# Altium footprint library 5.12-直插元件.PcbLib: 165 footprints (part 3 of 11)
Each footprint in its own frame and in the unit in brackets; x right, y up, seen from the top. Pads: shape width x height; smd on the part's side, far side on the other; paste and mask are expansions set on the pad; w line width, h text height; cw(c..) or ccw(c..) is an arc to the next point about the centre after c.
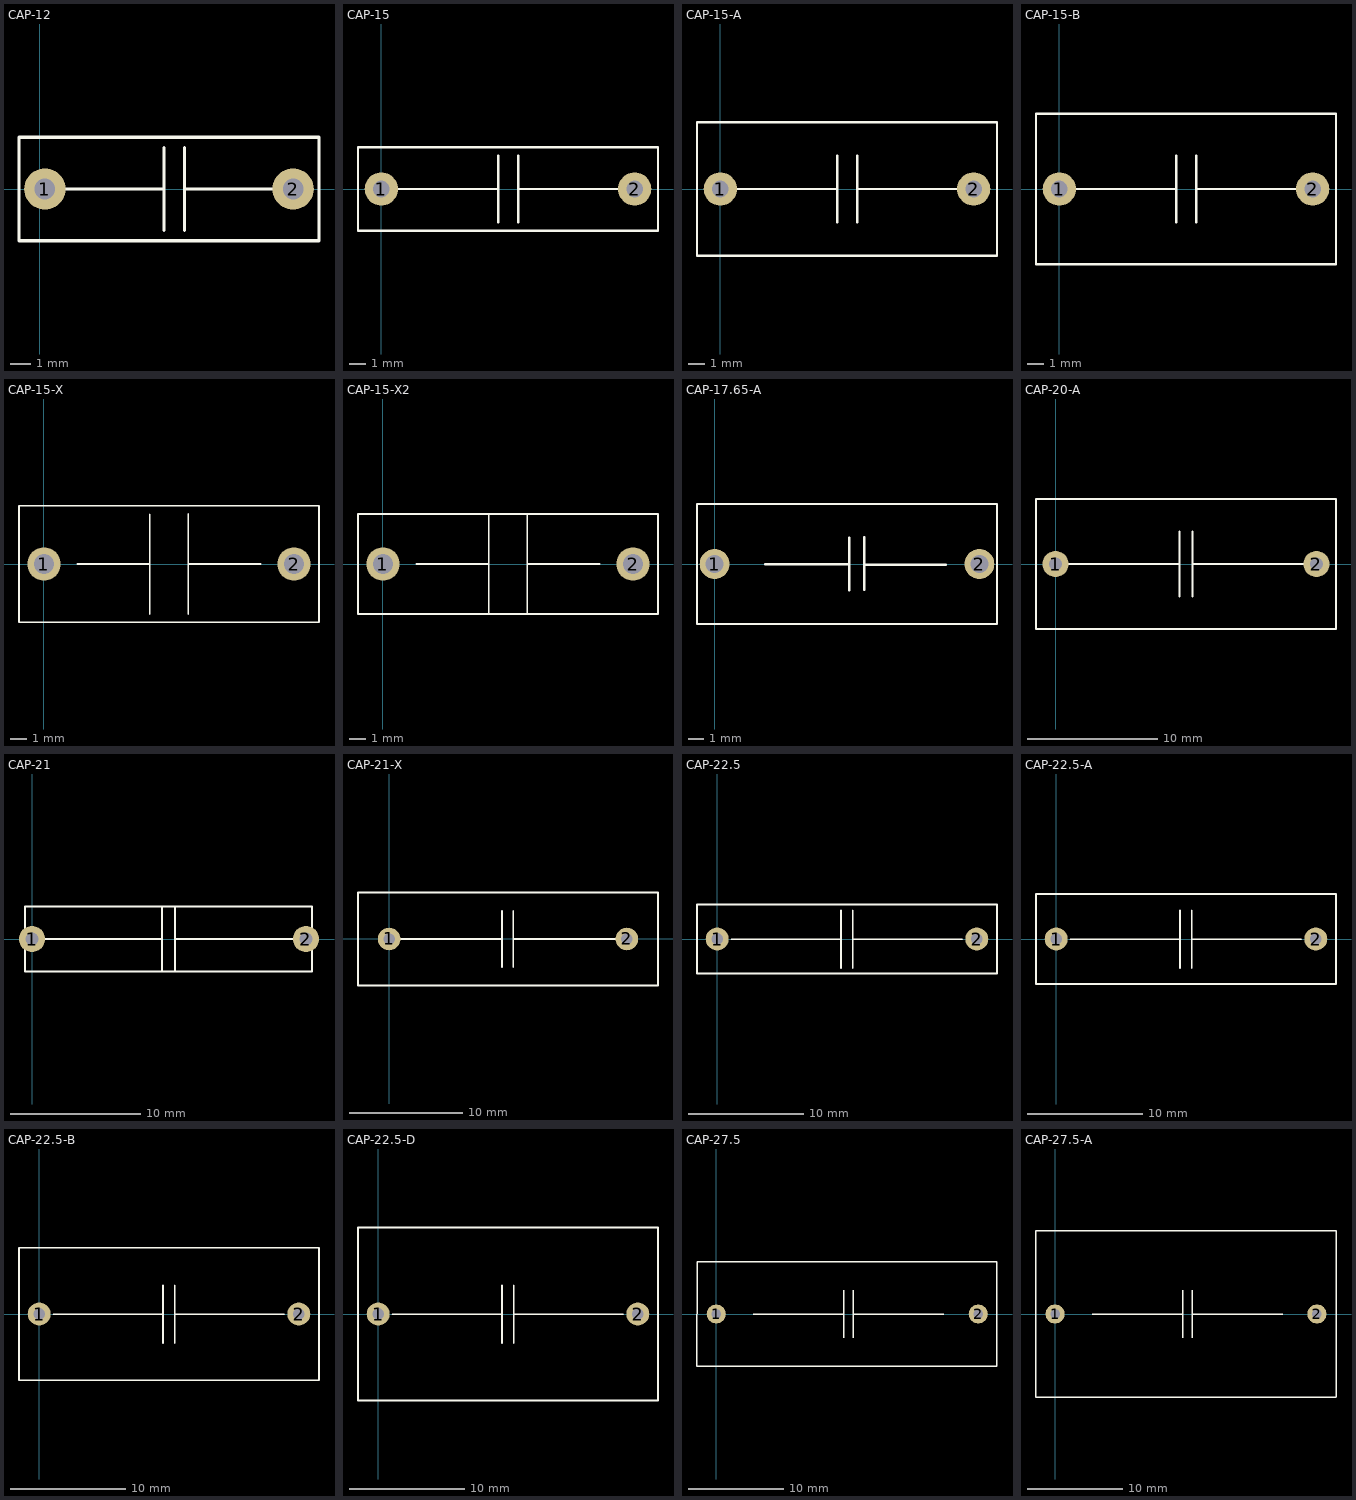
[diagram p2: the footprints below, top view; thin cyan lines are the x and y axes]

## CAP-12 [mm] "[ PCBѧϰȺ514746572 ]"
pads (2):
  round 2 hole 1: 1(0.25,0) 2(12.25,0)
Top Overlay:
  lines w0.15: 0,0 6,0 ; 6,-2 6,2 ; 7,-2 7,2 ; 7,0 13,0 ; -1,-2.5 -1,2.5 13.5,2.5 13.5,-2.5 -1,-2.5
3D body "User Library-SV07AC104KAA.step": height 12.7, standoff -31.75, extent -0.989,-2.54 13.489,2.54

## CAP-15 [mm] "[ PCBѧϰȺ514746572 ]"
pads (2):
  round 2 hole 1: 1(0,0) 2(15.2,0)
Top Overlay:
  lines w0.15: 0,0 7,0 ; 7,-2 7,2 ; 8.2,-2 8.2,2 ; 8.2,0 15.2,0 ; -1.4,-2.5 16.6,-2.5 16.6,2.5 -1.4,2.5 -1.4,-2.5
3D body "User Library-MKP10(P15)(B5)(H11).step": height 11, standoff -1.5, extent -1.4,-2.5 16.6,2.5

## CAP-15-A [mm] "[ PCBѧϰȺ514746572 ]"
pads (2):
  round 2 hole 1: 1(0,0) 2(15.2,0)
Top Overlay:
  lines w0.15: 0,0 7,0 ; 7,-2 7,2 ; 8.2,-2 8.2,2 ; 8.2,0 15.2,0 ; -1.4,-4 -1.4,4 16.6,4 16.6,-4 -1.4,-4
3D body "User Library-WIMA Capacitor.step": height 15, standoff -2.5, extent -1.4,-4 16.6,4
3D body "User Library-K73-17(18_8_15).step": height 16.5, standoff -1.5, extent -1.4,-4 16.6,4

## CAP-15-B [mm] "[ PCBѧϰȺ514746572 ]"
pads (2):
  round 2 hole 1: 1(0,0) 2(15.2,0)
Top Overlay:
  lines w0.15: 0,0 7,0 ; 7,-2 7,2 ; 8.2,-2 8.2,2 ; 8.2,0 15.2,0 ; -1.4,-4.5 -1.4,4.5 16.6,4.5 16.6,-4.5 -1.4,-4.5
3D body "User Library-K73-17(18_8_15).STEP": height 15, standoff -2.5, extent -1.4,-4.5 16.6,4.5

## CAP-15-X [mm] "[ PCBѧϰȺ514746572 ]"
pads (2):
  round 2 hole 1.2: 1(0,0) 2(15,0)
Top Overlay:
  lines w0.1: 2,0 6.35,0 ; 6.35,-3 6.35,2.977 ; 8.65,-3 8.65,3 ; 8.65,0 13,0 ; -1.5,-3.5 16.5,-3.5 16.5,3.5 -1.5,3.5 -1.5,-3.5
3D body "User Library-MKT(15_17x18x7).step": height 13.5, standoff -2, extent -1.5,-3.505 16.5,3.505

## CAP-15-X2 [mm] "[ PCBѧϰȺ514746572 ]"
pads (2):
  round 2 hole 1.2: 1(0,0) 2(15,0)
Top Overlay:
  lines w0.1: 2,0 6.35,0 ; 6.327,3 6.35,2.977 6.35,-3 ; 8.65,-3 8.65,3 ; 8.65,0 13,0 ; -1.5,-3 -1.5,3 16.5,3 16.5,-3 -1.5,-3
3D body "User Library-WIMA Capacitor.step": height 12, standoff -2.5, extent -1.5,-3 16.5,3

## CAP-17.65-A [mm] "[ PCBѧϰȺ514746572 ]"
pads (2):
  round 2 hole 1.2: 1(0,0) 2(17.65,0)
Top Overlay:
  lines w0.15: 3.38,-0.013 7.382,-0.013 8.96,-0.013 ; 8.975,-1.752 8.975,1.769 ; 9.969,-1.722 9.969,1.798 ; 10.042,-0.043 15.419,-0.043 ; -1.175,-4 18.825,-4 18.825,4 -1.175,4 -1.175,-4
3D body "User Library-K73-17(20_8_17).step": height 16, standoff -1.5, extent -1.175,-4 18.825,4

## CAP-20-A [mm] "[ PCBѧϰȺ514746572 ]"
pads (2):
  round 2 hole 1: 1(0,0) 2(20,0)
Top Overlay:
  lines w0.15: 0,0 9.5,0 ; 9.5,-2.5 9.5,2.5 ; 10.5,-2.5 10.5,2.5 ; 10.5,0 20,0 ; -1.5,-5 21.5,-5 21.5,5 -1.5,5 -1.5,-5
3D body "User Library-K73-17(23_10_20).step": height 22, standoff -2, extent -1.501,-5 21.499,5

## CAP-21 [mm] "[ PCBѧϰȺ514746572 ]"
pads (2):
  round 2 hole 1: 1(0,0) 2(21,0)
Top Overlay:
  lines w0.15: 0.477,0.002 9.977,0.002 ; 9.977,-2.498 9.977,2.502 ; 10.977,-2.498 10.977,2.502 ; 10.977,0.002 20.477,0.002 ; -0.524,-2.498 -0.524,2.502 21.476,2.502 21.476,-2.498 -0.524,-2.498
3D body "CAP-21.STEP": height 13, standoff -4, extent -0.524,-2.498 21.476,2.502

## CAP-21-X [mm] "[ PCBѧϰȺ514746572 ]"
pads (2):
  round 2 hole 1: 1(0,0) 2(21,0)
Top Overlay:
  lines w0.15: 0.477,0.002 9.977,0.002 ; 9.977,-2.498 9.977,2.502 ; 10.977,-2.498 10.977,2.502 ; 10.977,0.002 20.477,0.002 ; -2.749,-4.1 -2.749,4.1 23.751,4.1 23.751,-4.1 -2.749,-4.1
3D body "CAP-21-X2.STEP": height 17, standoff -1.5, extent -2.749,-4.1 23.751,4.1

## CAP-22.5 [mm] "[ PCBѧϰȺ514746572 ]"
pads (2):
  round 2 hole 1: 1(0,0) 2(22.5,0)
Top Overlay:
  lines w0.15: 1.237,-0.023 10.737,-0.023 ; 10.737,-2.523 10.737,2.477 ; 11.737,-2.523 11.737,2.477 ; 11.737,-0.023 21.237,-0.023 ; -1.75,-3 24.25,-3 24.25,3 -1.75,3 -1.75,-3
3D body "MKT(22_5_26x15x6).step": height 16, standoff -2, extent -1.75,-3.005 24.25,3.005

## CAP-22.5-A [mm] "[ PCBѧϰȺ514746572 ]"
pads (2):
  round 2 hole 1: 1(0,0) 2(22.5,0)
Top Overlay:
  lines w0.15: 1.237,-0.023 10.737,-0.023 ; 10.737,-2.523 10.737,2.477 ; 11.737,-2.523 11.737,2.477 ; 11.737,-0.023 21.237,-0.023 ; -1.75,-3.9 24.25,-3.9 24.25,3.9 -1.75,3.9 -1.75,-3.9
3D body "User Library-ECQE(F) 0_33uf 630Vdc 250Vac.step": height 18, standoff -4, extent -1.75,-3.9 24.25,3.9

## CAP-22.5-B [mm] "[ PCBѧϰȺ514746572 ]"
pads (2):
  round 2 hole 1: 1(0,0) 2(22.5,0)
Top Overlay:
  lines w0.15: 1.237,-0.023 10.737,-0.023 ; 10.737,-2.523 10.737,2.477 ; 11.737,-2.523 11.737,2.477 ; 11.737,-0.023 21.237,-0.023 ; -1.75,-5.75 24.25,-5.75 24.25,5.75 -1.75,5.75 -1.75,-5.75
3D body "User Library-ECQE(F) 0_68uf 630Vdc 250Vac.step": height 22, standoff -4, extent -1.75,-5.75 24.25,5.75

## CAP-22.5-D [mm] "[ PCBѧϰȺ514746572 ]"
pads (2):
  round 2 hole 1: 1(0,0) 2(22.5,0)
Top Overlay:
  lines w0.15: 1.237,-0.023 10.737,-0.023 ; 10.737,-2.523 10.737,2.477 ; 11.737,-2.523 11.737,2.477 ; 11.737,-0.023 21.237,-0.023 ; -1.75,-7.5 24.25,-7.5 24.25,7.5 -1.75,7.5 -1.75,-7.5
3D body "User Library-ECQE(F) 1_5uf 630Vdc 250Vac.step": height 25.7, standoff -4, extent -1.75,-7.65 24.25,7.65

## CAP-27.5 [mm] "[ PCBѧϰȺ514746572 ]"
pads (2):
  round 2 hole 1: 1(0,0) 2(27.5,0)
Top Overlay:
  lines w0.15: 3.901,0 13.401,0 ; 13.401,-2.5 13.401,2.5 ; 14.401,-2.5 14.401,2.5 ; 14.401,0 23.901,0 ; -2.023,-5.5 29.464,-5.5 29.468,5.5 -2.011,5.5 -2.023,-5.5
3D body "User Library-B32924E3225M.step": height 21, standoff -1.5, extent -2.021,-5.5 29.479,5.5

## CAP-27.5-A [mm] "[ PCBѧϰȺ514746572 ]"
pads (2):
  round 2 hole 1: 1(0,0) 2(27.5,0)
Top Overlay:
  lines w0.15: 3.901,0 13.401,0 ; 13.401,-2.5 13.401,2.5 ; 14.401,-2.5 14.401,2.5 ; 14.401,0 23.901,0 ; 29.487,-8.75 -2,-8.75 -2,8.75 29.5,8.75 29.5,-8.75
3D body "User Library-WIMA Capacitor.step": height 29, standoff -2.5, extent -2.007,-8.5 29.493,8.5